# Altium footprint library PCBKU.PcbLib: 190 footprints (part 2 of 12)
Each footprint in its own frame and in the unit in brackets; x right, y up, seen from the top. Pads: shape width x height; smd on the part's side, far side on the other; paste and mask are expansions set on the pad; w line width, h text height; cw(c..) or ccw(c..) is an arc to the next point about the centre after c.
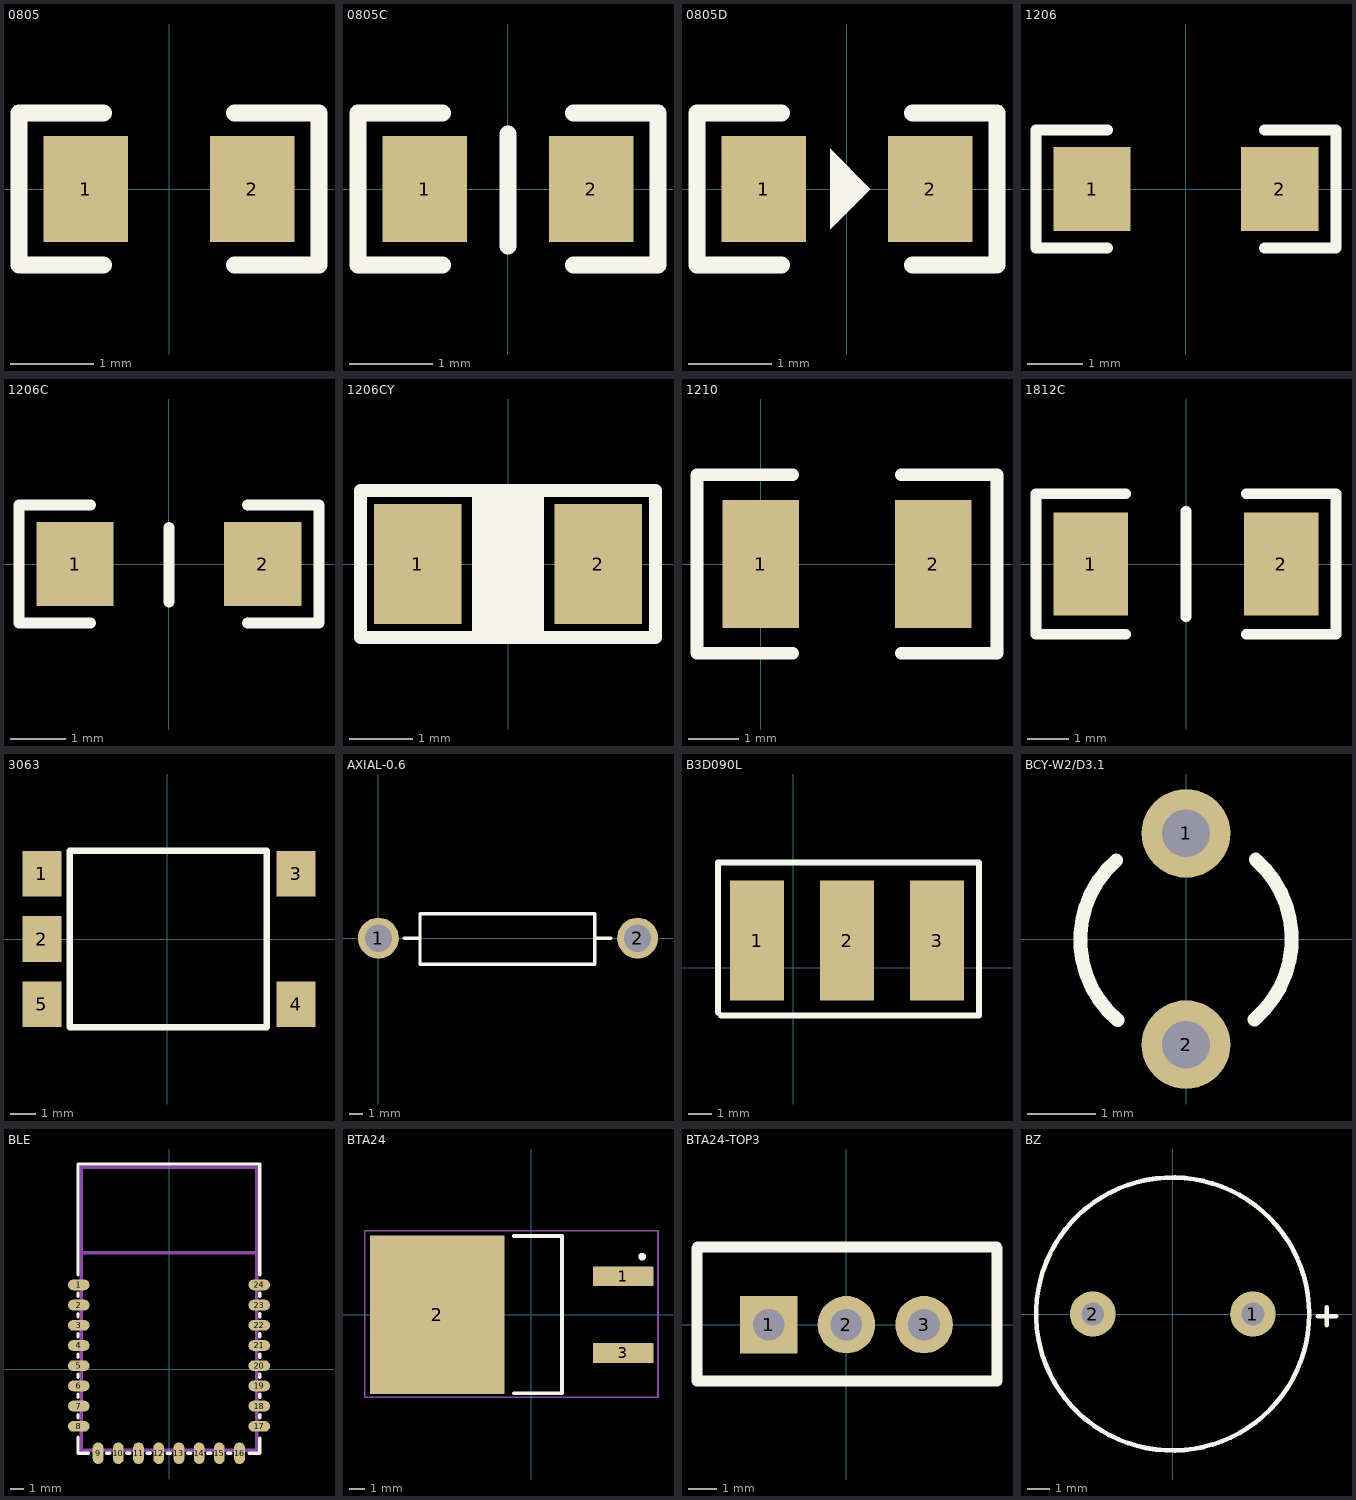
[diagram p1: the footprints below, top view; thin cyan lines are the x and y axes]

## 0805 [mm]
height 1.5
pads (2):
  rect 1.016x1.27 smd: 1(-1,0) 2(1,0)
Top Overlay:
  lines w0.203: -0.787,-0.914 -1.803,-0.914 -1.803,0.914 -0.787,0.914 ; 0.787,-0.914 1.803,-0.914 1.803,0.914 0.787,0.914
3D body: height 0.78, standoff 0, extent -1,-0.635 1,0.615

## 0805C [mm]
height 4.7
pads (2):
  rect 1.016x1.27 smd: 1(-1,0) 2(1,0)
Top Overlay:
  lines w0.203: -0.787,-0.914 -1.803,-0.914 -1.803,0.914 -0.787,0.914 ; 0,-0.686 0,0.66 ; 0.787,-0.914 1.803,-0.914 1.803,0.914 0.787,0.914
3D body: height 0.78, standoff 0, extent -1,-0.635 1,0.615

## 0805D [mm]
height 4.7
pads (2):
  rect 1.016x1.27 smd: 1(-1,0) 2(1,0)
Top Overlay:
  region: -0.203,0.483 0.279,0 -0.203,-0.483
  lines w0.203: -0.787,-0.914 -1.803,-0.914 -1.803,0.914 -0.787,0.914 ; 0.787,-0.914 1.803,-0.914 1.803,0.914 0.787,0.914
3D body: height 0.9, standoff -0.01, extent -1.126,-0.686 0.974,0.664

## 1206 [mil]
height 43.31
pads (2):
  rect 55x60 smd: 1(-66.93,0) 2(66.93,0)
Top Overlay:
  lines w8: -55.93,-42 -106.93,-42 -106.93,42 -55.93,42 ; 56.07,-42 107.07,-42 107.07,42 56.07,42
3D body: height 39.45, standoff 0, extent -62.92,-31.99 63.06,31

## 1206C [mil]
pads (2):
  rect 55x60 smd: 1(-66.93,0) 2(66.93,0)
Top Overlay:
  lines w8: -55.93,-42 -106.93,-42 -106.93,42 -55.93,42 ; 0.07,-27 0.07,26 ; 56.07,-42 107.07,-42 107.07,42 56.07,42
3D body: height 39.45, standoff 0, extent -61.99,-32 63.99,30.99

## 1206CY [mil]
height 43.31
pads (2):
  rect 55x75 smd: 1(-56.5,0) 2(56.5,0)
Top Overlay:
  rectangle: -22.5,-46 22.5,46
  lines w8: -92.5,-46 92.5,-46 92.5,46 -92.5,46 -92.5,-46

## 1210 [mil]
pads (2):
  rect 60x100 smd: 1(0,0) 2(135,0)
Top Overlay:
  lines w10: 25,-70 -50,-70 -50,70 25,70 ; 110,-70 185,-70 185,70 110,70

## 1812C [mm]
pads (2):
  rect 1.8x2.5 smd: 1(-2.3,0) 2(2.3,0)
Top Overlay:
  lines w0.254: -1.46,-1.7 -3.626,-1.7 -3.626,1.7 -1.46,1.7 ; 0,-1.27 0,1.27 ; 1.46,-1.7 3.626,-1.7 3.626,1.7 1.46,1.7

## 3063 [mm]
pads (5):
  rect 1.52x1.78 smd: 1(-4.889,2.54) 2(-4.889,0) 3(5.016,2.54) 4(5.016,-2.54) 5(-4.889,-2.54)
Top Overlay:
  lines w0.254: -3.81,-3.429 3.873,-3.429 3.873,3.431 -3.81,3.431 -3.81,-3.429

## AXIAL-0.6 [mm]
pads (2):
  round 3 hole 2: 1(0,0) 2(19,0)
Top Overlay:
  lines w0.254: 1.905,0 2.921,0 ; 15.875,0 17.018,0 ; 3.048,-1.905 3.048,1.778 15.875,1.778 15.875,-1.905 3.048,-1.905

## B3D090L [mil]
pads (3):
  rect 90x200 smd: 1(-60,45) 2(90,45) 3(240,45)
Top Overlay:
  lines w10: -125,-75 -120,-80 310,-80 310,175 -110,175 -125,175 -125,-75

## BCY-W2/D3.1 [mm]
height 1.1
pads (2):
  round 1.3 hole 0.7: 1(0,1.55) 2(0,-1.55)
Top Overlay:
  lines w0.203: -1.022,1.155 ccw(c0,-0.01) -1.006,-1.189 ; 1.006,-1.179 ccw(c0,0) 1.022,1.165

## BLE [mm]
pads (24):
  oval 1.6x0.8 smd: 1(-6.7,6.25) 2(-6.7,4.75) 3(-6.7,3.25) 4(-6.7,1.75) 5(-6.7,0.25) 6(-6.7,-1.25) 7(-6.7,-2.75) 8(-6.7,-4.25) 17(6.7,-4.25) 18(6.7,-2.75) 19(6.7,-1.25) 20(6.7,0.25) 21(6.7,1.75) 22(6.7,3.25) 23(6.7,4.75) 24(6.7,6.25)
  oval 0.8x1.6 smd: 9(-5.262,-6.25) 10(-3.762,-6.25) 11(-2.262,-6.25) 12(-0.762,-6.25) 13(0.738,-6.25) 14(2.238,-6.25) 15(3.738,-6.25) 16(5.238,-6.25)
Top Overlay:
  lines w0.254: -6.756,-5.055 -6.756,-6.239 -6.004,-6.239 ; -6.756,-3.607 -6.756,-3.378 ; -6.756,-2.108 -6.756,-1.88 ; -6.756,-0.61 -6.756,-0.381 ; -6.756,0.889 -6.756,1.118 ; -6.756,2.388 -6.756,2.616 ; -6.756,3.886 -6.756,4.115 ; -6.756,5.385 -6.756,5.613 ; -6.756,6.985 -6.756,15.224 6.731,15.224 6.731,7.01 ; -4.623,-6.239 -4.394,-6.239 ; -3.124,-6.239 -2.896,-6.239 ; -1.626,-6.239 -1.397,-6.239 ; -0.127,-6.239 0.102,-6.239 ; 1.372,-6.239 1.6,-6.239 ; 2.87,-6.239 3.099,-6.239 ; 4.369,-6.239 4.597,-6.239 ; 5.944,-6.239 6.731,-6.239 6.731,-5.131 ; 6.731,-3.607 6.731,-3.378 ; 6.731,-2.108 6.731,-1.88 ; 6.731,-0.61 6.731,-0.381 ; 6.731,0.889 6.731,1.118 ; 6.731,2.388 6.731,2.616 ; 6.731,3.886 6.731,4.115 ; 6.731,5.385 6.731,5.613
Mechanical 15:
  lines w0.254: -6.5,8.62 6.5,8.62 ; -6.5,-6.028 6.5,-6.028 6.5,14.97 -6.5,14.97 -6.5,-6.028

## BTA24 [mm] "D2-PAK, 6-Leads, Body 8.6x10.2mm, Pitch 1.7mm, Lead Span 14.1mm, IPC Medium Density"
height 4.65
pads (3):
  rect 4x1.3 smd: 1(6.096,2.54) 3(6.096,-2.54)
  rect 8.9x10.5 smd: 2(-6.223,0)
Top Overlay:
  circle w0.25: c7.335,3.84 r0.125
  lines w0.254: -1.143,-5.207 2.032,-5.207 2.032,5.207 -1.143,5.207
Mechanical 15:
  lines w0.1: -11.025,-5.461 -11.025,5.539 ; -11.018,-5.461 8.382,-5.461 8.382,5.539 -11.018,5.539

## BTA24-TOP3 [mm]
pads (3):
  rect 2x2 hole 1.1: 1(-2.7,0)
  round 2 hole 1.1: 2(0,0) 3(2.7,0)
Top Overlay:
  lines w0.381: -5.2,2.67 -5.2,-1.956 5.239,-1.956 5.239,2.67 ; -5.182,2.7 5.218,2.7

## BZ [mm]
pads (2):
  round 2 hole 1: 1(3.518,0) 2(-3.518,0)
Top Overlay:
  circle w0.203: c-0.013,0 r6
  lines w0.2: 6.368,-0.104 7.168,-0.104 ; 6.768,-0.504 6.768,0.296